# Altium schematic symbol library Oscillators - Crystals.SchLib: 746 symbols (part 4 of 5) (continued)
## CX3225GB16000P0HPQCC (continued)
CRYSTAL 16.0000MHZ 18PF SMD; Part Number: CX3225GB16000P0HPQCC; Manufacturer: Kyocera International Inc. Electronic Components; ESR (Equivalent Series Resistance): 80 Ohms; Frequency Stability: ±30ppm; Frequency Tolerance: ±20ppm; Operating Mode: Fundamental; ComponentLink1Description: Datasheet; ComponentLink1URL: //media.digikey.com/pdf/Data%20Sheets/AVX%20PDFs/CX3225GB_Series_Spec.pdf; ComponentLink2Description: DigiKey Link; ComponentLink2URL: http://digikey.com/product-detail/en/kyocera-international-inc-electronic-components/CX3225GB16000P0HPQCC/1253-1182-1-ND/4454030; Frequency: 16MHz; Height - Seated (Max): 0.035" (0.90mm); LastUpdated: 9/2/2020 1:21:57 AM; Lifecycle Status: Active; Load Capacitance: 18pF; Minimum Order: 1; Mounting Type: Surface Mount; Operating Temperature: -40°C ~ 85°C; Package / Case: 4-SMD, No Lead; Packaging: TapeAndReel; PartId: 490; Part Status: Active; Price: 0.35; Series: CX3225GB, Kyocera; Size / Dimension: 0.126" L x 0.098" W (3.20mm x 2.50mm); Supplier 1: DigiKey; Supplier Part Number 1: 1253-1182-1-ND; Type: MHz Crystal; Value: 16MHz
footprint KYOCERA CX3225GB
pins: 1, 3

## CX3225GB16384P0HPQCC
designator Y?, comment 16.384MHz
CRYSTAL 16.3840MHZ 18PF SMD; Part Number: CX3225GB16384P0HPQCC; Manufacturer: Kyocera International Inc. Electronic Components; ESR (Equivalent Series Resistance): 80 Ohms; Frequency Stability: ±30ppm; Frequency Tolerance: ±20ppm; Operating Mode: Fundamental; ComponentLink1Description: Datasheet; ComponentLink1URL: //media.digikey.com/pdf/Data%20Sheets/AVX%20PDFs/CX3225GB_Series_Spec.pdf; ComponentLink2Description: DigiKey Link; ComponentLink2URL: http://digikey.com/product-detail/en/kyocera-international-inc-electronic-components/CX3225GB16384P0HPQCC/1253-1183-1-ND/4454031; Frequency: 16.384MHz; Height - Seated (Max): 0.035" (0.90mm); LastUpdated: 9/2/2020 1:21:57 AM; Lifecycle Status: Active; Load Capacitance: 18pF; Minimum Order: 1; Mounting Type: Surface Mount; Operating Temperature: -40°C ~ 85°C; Package / Case: 4-SMD, No Lead; Packaging: TapeAndReel; PartId: 507; Part Status: Active; Price: 0.39; Series: CX3225GB, Kyocera; Size / Dimension: 0.126" L x 0.098" W (3.20mm x 2.50mm); Supplier 1: DigiKey; Supplier Part Number 1: 1253-1183-1-ND; Type: MHz Crystal; Value: 16.384MHz
footprint KYOCERA CX3225GB
pins: 1, 3

## CX3225GB18432D0HEQCC
designator Y?, comment 18.432MHz
CRYSTAL 18.4320MHZ 8PF SMD; Part Number: CX3225GB18432D0HEQCC; Manufacturer: Kyocera International Inc. Electronic Components; ESR (Equivalent Series Resistance): 80 Ohms; Frequency Stability: ±30ppm; Frequency Tolerance: ±20ppm; Operating Mode: Fundamental; ComponentLink1Description: Datasheet; ComponentLink1URL: //media.digikey.com/pdf/Data%20Sheets/AVX%20PDFs/CX3225GBxD0HEQ_Series_Spec.pdf; ComponentLink2Description: DigiKey Link; ComponentLink2URL: http://digikey.com/product-detail/en/kyocera-international-inc-electronic-components/CX3225GB18432D0HEQCC/1253-1184-1-ND/4453987; Frequency: 18.432MHz; Height - Seated (Max): 0.035" (0.90mm); LastUpdated: 9/2/2020 1:21:57 AM; Lifecycle Status: Active; Load Capacitance: 8pF; Minimum Order: 1; Mounting Type: Surface Mount; Operating Temperature: -10°C ~ 70°C; Package / Case: 4-SMD, No Lead; Packaging: TapeAndReel; PartId: 495; Part Status: Active; Price: 0.38; Series: CX3225GB, Kyocera; Size / Dimension: 0.126" L x 0.098" W (3.20mm x 2.50mm); Supplier 1: DigiKey; Supplier Part Number 1: 1253-1184-1-ND; Type: MHz Crystal; Value: 18.432MHz
footprint KYOCERA CX3225GB
pins: 1, 3

## CX3225GB19200P0HPQCC
designator Y?, comment 19.2MHz
CRYSTAL 19.2000MHZ 18PF SMD; Part Number: CX3225GB19200P0HPQCC; Manufacturer: Kyocera International Inc. Electronic Components; ESR (Equivalent Series Resistance): 80 Ohms; Frequency Stability: ±30ppm; Frequency Tolerance: ±20ppm; Operating Mode: Fundamental; ComponentLink1Description: Datasheet; ComponentLink1URL: //media.digikey.com/pdf/Data%20Sheets/AVX%20PDFs/CX3225GB_Series_Spec.pdf; ComponentLink2Description: DigiKey Link; ComponentLink2URL: http://digikey.com/product-detail/en/kyocera-international-inc-electronic-components/CX3225GB19200P0HPQCC/1253-1189-1-ND/4454033; Frequency: 19.2MHz; Height - Seated (Max): 0.035" (0.90mm); LastUpdated: 9/2/2020 1:21:57 AM; Lifecycle Status: Active; Load Capacitance: 18pF; Minimum Order: 1; Mounting Type: Surface Mount; Operating Temperature: -40°C ~ 85°C; Package / Case: 4-SMD, No Lead; Packaging: TapeAndReel; PartId: 506; Part Status: Active; Price: 0.39; Series: CX3225GB, Kyocera; Size / Dimension: 0.126" L x 0.098" W (3.20mm x 2.50mm); Supplier 1: DigiKey; Supplier Part Number 1: 1253-1189-1-ND; Type: MHz Crystal; Value: 19.2MHz
footprint KYOCERA CX3225GB
pins: 1, 3

## CX3225GB20000D0HPQCC
designator Y?, comment 20MHz
CRYSTAL 20.0000MHZ 8PF SMD; Part Number: CX3225GB20000D0HPQCC; Manufacturer: Kyocera International Inc. Electronic Components; ESR (Equivalent Series Resistance): 60 Ohms; Frequency Stability: ±30ppm; Frequency Tolerance: ±20ppm; Operating Mode: Fundamental; ComponentLink1Description: Datasheet; ComponentLink1URL: //media.digikey.com/pdf/Data%20Sheets/AVX%20PDFs/CX3225GBxD0HPQCC_Series_Spec.pdf; ComponentLink2Description: DigiKey Link; ComponentLink2URL: http://digikey.com/product-detail/en/kyocera-international-inc-electronic-components/CX3225GB20000D0HPQCC/1253-1191-1-ND/4454010; Frequency: 20MHz; Height - Seated (Max): 0.035" (0.90mm); LastUpdated: 9/2/2020 1:21:57 AM; Lifecycle Status: Active; Load Capacitance: 8pF; Minimum Order: 1; Mounting Type: Surface Mount; Operating Temperature: -40°C ~ 85°C; Package / Case: 4-SMD, No Lead; Packaging: TapeAndReel; PartId: 508; Part Status: Active; Price: 0.39; Series: CX3225GB, Kyocera; Size / Dimension: 0.126" L x 0.098" W (3.20mm x 2.50mm); Supplier 1: DigiKey; Supplier Part Number 1: 1253-1191-1-ND; Type: MHz Crystal; Value: 20MHz
footprint KYOCERA CX3225GB
pins: 1, 3

## CX3225GB22579P0HPQCC
designator Y?, comment 22.5792MHz
CRYSTAL 22.5792MHZ 18PF SMD; Part Number: CX3225GB22579P0HPQCC; Manufacturer: Kyocera International Inc. Electronic Components; ESR (Equivalent Series Resistance): 60 Ohms; Frequency Stability: ±30ppm; Frequency Tolerance: ±20ppm; Operating Mode: Fundamental; ComponentLink1Description: Datasheet; ComponentLink1URL: //media.digikey.com/pdf/Data%20Sheets/AVX%20PDFs/CX3225GB_Series_Spec.pdf; ComponentLink2Description: DigiKey Link; ComponentLink2URL: http://digikey.com/product-detail/en/kyocera-international-inc-electronic-components/CX3225GB22579P0HPQCC/1253-1195-1-ND/4454035; Frequency: 22.5792MHz; Height - Seated (Max): 0.035" (0.90mm); LastUpdated: 9/2/2020 1:21:57 AM; Lifecycle Status: Active; Load Capacitance: 18pF; Minimum Order: 1; Mounting Type: Surface Mount; Operating Temperature: -40°C ~ 85°C; Package / Case: 4-SMD, No Lead; Packaging: TapeAndReel; PartId: 497; Part Status: Active; Price: 0.39; Series: CX3225GB, Kyocera; Size / Dimension: 0.126" L x 0.098" W (3.20mm x 2.50mm); Supplier 1: DigiKey; Supplier Part Number 1: 1253-1195-1-ND; Type: MHz Crystal; Value: 22.5792MHz
footprint KYOCERA CX3225GB
pins: 1, 3

## CX3225GB24000D0HEQCC
designator Y?, comment 24MHz
CRYSTAL 24.0000MHZ 8PF SMD; Part Number: CX3225GB24000D0HEQCC; Manufacturer: Kyocera International Inc. Electronic Components; ESR (Equivalent Series Resistance): 60 Ohms; Frequency Stability: ±30ppm; Frequency Tolerance: ±20ppm; Operating Mode: Fundamental; ComponentLink1Description: Datasheet; ComponentLink1URL: //media.digikey.com/pdf/Data%20Sheets/AVX%20PDFs/CX3225GBxD0HEQ_Series_Spec.pdf; ComponentLink2Description: DigiKey Link; ComponentLink2URL: http://digikey.com/product-detail/en/kyocera-international-inc-electronic-components/CX3225GB24000D0HEQCC/1253-1196-1-ND/4453991; Frequency: 24MHz; Height - Seated (Max): 0.035" (0.90mm); LastUpdated: 9/2/2020 1:21:57 AM; Lifecycle Status: Active; Load Capacitance: 8pF; Minimum Order: 1; Mounting Type: Surface Mount; Operating Temperature: -10°C ~ 70°C; Package / Case: 4-SMD, No Lead; Packaging: TapeAndReel; PartId: 504; Part Status: Active; Price: 0.33; Series: CX3225GB, Kyocera; Size / Dimension: 0.126" L x 0.098" W (3.20mm x 2.50mm); Supplier 1: DigiKey; Supplier Part Number 1: 1253-1196-1-ND; Type: MHz Crystal; Value: 24MHz
footprint KYOCERA CX3225GB
pins: 1, 3

## CX3225GB24000P0HPQCC
designator Y?, comment 24MHz
CRYSTAL 24.0000MHZ 18PF SMD; Part Number: CX3225GB24000P0HPQCC; Manufacturer: Kyocera International Inc. Electronic Components; ESR (Equivalent Series Resistance): 60 Ohms; Frequency Stability: ±30ppm; Frequency Tolerance: ±20ppm; Operating Mode: Fundamental; ComponentLink1Description: Datasheet; ComponentLink1URL: //media.digikey.com/pdf/Data%20Sheets/AVX%20PDFs/CX3225GB_Series_Spec.pdf; ComponentLink2Description: DigiKey Link; ComponentLink2URL: http://digikey.com/product-detail/en/kyocera-international-inc-electronic-components/CX3225GB24000P0HPQCC/1253-1198-1-ND/4454036; Frequency: 24MHz; Height - Seated (Max): 0.035" (0.90mm); LastUpdated: 9/2/2020 1:21:57 AM; Lifecycle Status: Active; Load Capacitance: 18pF; Minimum Order: 1; Mounting Type: Surface Mount; Operating Temperature: -40°C ~ 85°C; Package / Case: 4-SMD, No Lead; Packaging: TapeAndReel; PartId: 491; Part Status: Active; Price: 0.35; Series: CX3225GB, Kyocera; Size / Dimension: 0.126" L x 0.098" W (3.20mm x 2.50mm); Supplier 1: DigiKey; Supplier Part Number 1: 1253-1198-1-ND; Type: MHz Crystal; Value: 24MHz
footprint KYOCERA CX3225GB
pins: 1, 3

## CX3225GB24576D0HPQCC
designator Y?, comment 24.576MHz
CRYSTAL 24.5760MHZ 8PF SMD; Part Number: CX3225GB24576D0HPQCC; Manufacturer: Kyocera International Inc. Electronic Components; ESR (Equivalent Series Resistance): 60 Ohms; Frequency Stability: ±30ppm; Frequency Tolerance: ±20ppm; Operating Mode: Fundamental; ComponentLink1Description: Datasheet; ComponentLink1URL: //media.digikey.com/pdf/Data%20Sheets/AVX%20PDFs/CX3225GBxD0HPQCC_Series_Spec.pdf; ComponentLink2Description: DigiKey Link; ComponentLink2URL: http://digikey.com/product-detail/en/kyocera-international-inc-electronic-components/CX3225GB24576D0HPQCC/1253-1200-1-ND/4454013; Frequency: 24.576MHz; Height - Seated (Max): 0.035" (0.90mm); LastUpdated: 9/2/2020 1:21:57 AM; Lifecycle Status: Active; Load Capacitance: 8pF; Minimum Order: 1; Mounting Type: Surface Mount; Operating Temperature: -40°C ~ 85°C; Package / Case: 4-SMD, No Lead; Packaging: TapeAndReel; PartId: 486; Part Status: Active; Price: 0.39; Series: CX3225GB, Kyocera; Size / Dimension: 0.126" L x 0.098" W (3.20mm x 2.50mm); Supplier 1: DigiKey; Supplier Part Number 1: 1253-1200-1-ND; Type: MHz Crystal; Value: 24.576MHz
footprint KYOCERA CX3225GB
pins: 1, 3

## CX3225GB25000D0HEQCC
designator Y?, comment 25MHz
CRYSTAL 25.0000MHZ 8PF SMD; Part Number: CX3225GB25000D0HEQCC; Manufacturer: Kyocera International Inc. Electronic Components; ESR (Equivalent Series Resistance): 60 Ohms; Frequency Stability: ±30ppm; Frequency Tolerance: ±20ppm; Operating Mode: Fundamental; ComponentLink1Description: Datasheet; ComponentLink1URL: //media.digikey.com/pdf/Data%20Sheets/AVX%20PDFs/CX3225GBxD0HEQ_Series_Spec.pdf; ComponentLink2Description: DigiKey Link; ComponentLink2URL: http://digikey.com/product-detail/en/kyocera-international-inc-electronic-components/CX3225GB25000D0HEQCC/1253-1202-1-ND/4453993; Frequency: 25MHz; Height - Seated (Max): 0.035" (0.90mm); LastUpdated: 9/2/2020 1:21:57 AM; Lifecycle Status: Active; Load Capacitance: 8pF; Minimum Order: 1; Mounting Type: Surface Mount; Operating Temperature: -10°C ~ 70°C; Package / Case: 4-SMD, No Lead; Packaging: TapeAndReel; PartId: 494; Part Status: Active; Price: 0.38; Series: CX3225GB, Kyocera; Size / Dimension: 0.126" L x 0.098" W (3.20mm x 2.50mm); Supplier 1: DigiKey; Supplier Part Number 1: 1253-1202-1-ND; Type: MHz Crystal; Value: 25MHz
footprint KYOCERA CX3225GB
pins: 1, 3

## CX3225GB25000D0HPQCC
designator Y?, comment 25MHz
CRYSTAL 25.0000MHZ 8PF SMD; Part Number: CX3225GB25000D0HPQCC; Manufacturer: Kyocera International Inc. Electronic Components; ESR (Equivalent Series Resistance): 60 Ohms; Frequency Stability: ±30ppm; Frequency Tolerance: ±20ppm; Operating Mode: Fundamental; ComponentLink1Description: Datasheet; ComponentLink1URL: //media.digikey.com/pdf/Data%20Sheets/AVX%20PDFs/CX3225GBxD0HPQCC_Series_Spec.pdf; ComponentLink2Description: DigiKey Link; ComponentLink2URL: http://digikey.com/product-detail/en/kyocera-international-inc-electronic-components/CX3225GB25000D0HPQCC/1253-1203-1-ND/4454014; Frequency: 25MHz; Height - Seated (Max): 0.035" (0.90mm); LastUpdated: 9/2/2020 1:21:57 AM; Lifecycle Status: Active; Load Capacitance: 8pF; Minimum Order: 1; Mounting Type: Surface Mount; Operating Temperature: -40°C ~ 85°C; Package / Case: 4-SMD, No Lead; Packaging: TapeAndReel; PartId: 505; Part Status: Active; Price: 0.39; Series: CX3225GB, Kyocera; Size / Dimension: 0.126" L x 0.098" W (3.20mm x 2.50mm); Supplier 1: DigiKey; Supplier Part Number 1: 1253-1203-1-ND; Type: MHz Crystal; Value: 25MHz
footprint KYOCERA CX3225GB
pins: 1, 3

## CX3225GB25000P0HPQCC
designator Y?, comment 25MHz
CRYSTAL 25.0000MHZ 18PF SMD; Part Number: CX3225GB25000P0HPQCC; Manufacturer: Kyocera International Inc. Electronic Components; ESR (Equivalent Series Resistance): 60 Ohms; Frequency Stability: ±30ppm; Frequency Tolerance: ±20ppm; Operating Mode: Fundamental; ComponentLink1Description: Datasheet; ComponentLink1URL: //media.digikey.com/pdf/Data%20Sheets/AVX%20PDFs/CX3225GB_Series_Spec.pdf; ComponentLink2Description: DigiKey Link; ComponentLink2URL: http://digikey.com/product-detail/en/kyocera-international-inc-electronic-components/CX3225GB25000P0HPQCC/1253-1204-1-ND/4454038; Frequency: 25MHz; Height - Seated (Max): 0.035" (0.90mm); LastUpdated: 9/2/2020 1:21:57 AM; Lifecycle Status: Active; Load Capacitance: 18pF; Minimum Order: 1; Mounting Type: Surface Mount; Operating Temperature: -40°C ~ 85°C; Package / Case: 4-SMD, No Lead; Packaging: TapeAndReel; PartId: 500; Part Status: Active; Price: 0.41; Series: CX3225GB, Kyocera; Size / Dimension: 0.126" L x 0.098" W (3.20mm x 2.50mm); Supplier 1: DigiKey; Supplier Part Number 1: 1253-1204-1-ND; Type: MHz Crystal; Value: 25MHz
footprint KYOCERA CX3225GB
pins: 1, 3

## CX3225GB27000D0HEQCC
designator Y?, comment 27MHz
CRYSTAL 27.0000MHZ 8PF SMD; Part Number: CX3225GB27000D0HEQCC; Manufacturer: Kyocera International Inc. Electronic Components; ESR (Equivalent Series Resistance): 50 Ohms; Frequency Stability: ±30ppm; Frequency Tolerance: ±20ppm; Operating Mode: Fundamental; ComponentLink1Description: Datasheet; ComponentLink1URL: //media.digikey.com/pdf/Data%20Sheets/AVX%20PDFs/CX3225GBxD0HEQ_Series_Spec.pdf; ComponentLink2Description: DigiKey Link; ComponentLink2URL: http://digikey.com/product-detail/en/kyocera-international-inc-electronic-components/CX3225GB27000D0HEQCC/1253-1205-1-ND/4453994; Frequency: 27MHz; Height - Seated (Max): 0.035" (0.90mm); LastUpdated: 9/2/2020 1:21:56 AM; Lifecycle Status: Active; Load Capacitance: 8pF; Minimum Order: 1; Mounting Type: Surface Mount; Operating Temperature: -10°C ~ 70°C; Package / Case: 4-SMD, No Lead; Packaging: TapeAndReel; PartId: 511; Part Status: Active; Price: 0.38; Series: CX3225GB, Kyocera; Size / Dimension: 0.126" L x 0.098" W (3.20mm x 2.50mm); Supplier 1: DigiKey; Supplier Part Number 1: 1253-1205-1-ND; Type: MHz Crystal; Value: 27MHz
footprint KYOCERA CX3225GB
pins: 1, 3

## CX3225GB27000P0HPQCC
designator Y?, comment 27MHz
CRYSTAL 27.0000MHZ 18PF SMD; Part Number: CX3225GB27000P0HPQCC; Manufacturer: Kyocera International Inc. Electronic Components; ESR (Equivalent Series Resistance): 50 Ohms; Frequency Stability: ±30ppm; Frequency Tolerance: ±20ppm; Operating Mode: Fundamental; ComponentLink1Description: Datasheet; ComponentLink1URL: //media.digikey.com/pdf/Data%20Sheets/AVX%20PDFs/CX3225GB_Series_Spec.pdf; ComponentLink2Description: DigiKey Link; ComponentLink2URL: http://digikey.com/product-detail/en/kyocera-international-inc-electronic-components/CX3225GB27000P0HPQCC/1253-1207-1-ND/4454039; Frequency: 27MHz; Height - Seated (Max): 0.035" (0.90mm); LastUpdated: 9/2/2020 1:21:57 AM; Lifecycle Status: Active; Load Capacitance: 18pF; Minimum Order: 1; Mounting Type: Surface Mount; Operating Temperature: -40°C ~ 85°C; Package / Case: 4-SMD, No Lead; Packaging: TapeAndReel; PartId: 498; Part Status: Active; Price: 0.39; Series: CX3225GB, Kyocera; Size / Dimension: 0.126" L x 0.098" W (3.20mm x 2.50mm); Supplier 1: DigiKey; Supplier Part Number 1: 1253-1207-1-ND; Type: MHz Crystal; Value: 27MHz
footprint KYOCERA CX3225GB
pins: 1, 3

## CX3225GB27120P0HPQCC
designator Y?, comment 27.12MHz
CRYSTAL 27.1200MHZ 18PF SMD; Part Number: CX3225GB27120P0HPQCC; Manufacturer: Kyocera International Inc. Electronic Components; ESR (Equivalent Series Resistance): 50 Ohms; Frequency Stability: ±30ppm; Frequency Tolerance: ±20ppm; Operating Mode: Fundamental; ComponentLink1Description: Datasheet; ComponentLink1URL: //media.digikey.com/pdf/Data%20Sheets/AVX%20PDFs/CX3225GB_Series_Spec.pdf; ComponentLink2Description: DigiKey Link; ComponentLink2URL: http://digikey.com/product-detail/en/kyocera-international-inc-electronic-components/CX3225GB27120P0HPQCC/1253-1208-1-ND/4454040; Frequency: 27.12MHz; Height - Seated (Max): 0.035" (0.90mm); LastUpdated: 9/2/2020 1:21:57 AM; Lifecycle Status: Active; Load Capacitance: 18pF; Minimum Order: 1; Mounting Type: Surface Mount; Operating Temperature: -40°C ~ 85°C; Package / Case: 4-SMD, No Lead; Packaging: TapeAndReel; PartId: 501; Part Status: Active; Price: 0.41; Series: CX3225GB, Kyocera; Size / Dimension: 0.126" L x 0.098" W (3.20mm x 2.50mm); Supplier 1: DigiKey; Supplier Part Number 1: 1253-1208-1-ND; Type: MHz Crystal; Value: 27.12MHz
footprint KYOCERA CX3225GB
pins: 1, 3

## CX3225GB32000D0HEQCC
designator Y?, comment 32MHz
CRYSTAL 32.0000MHZ 8PF SMD; Part Number: CX3225GB32000D0HEQCC; Manufacturer: Kyocera International Inc. Electronic Components; ESR (Equivalent Series Resistance): 50 Ohms; Frequency Stability: ±30ppm; Frequency Tolerance: ±20ppm; Operating Mode: Fundamental; ComponentLink1Description: Datasheet; ComponentLink1URL: //media.digikey.com/pdf/Data%20Sheets/AVX%20PDFs/CX3225GBxD0HEQ_Series_Spec.pdf; ComponentLink2Description: DigiKey Link; ComponentLink2URL: http://digikey.com/product-detail/en/kyocera-international-inc-electronic-components/CX3225GB32000D0HEQCC/1253-1212-1-ND/4453996; Frequency: 32MHz; Height - Seated (Max): 0.035" (0.90mm); LastUpdated: 9/2/2020 1:21:57 AM; Lifecycle Status: Active; Load Capacitance: 8pF; Minimum Order: 1; Mounting Type: Surface Mount; Operating Temperature: -10°C ~ 70°C; Package / Case: 4-SMD, No Lead; Packaging: TapeAndReel; PartId: 493; Part Status: Active; Price: 0.38; Series: CX3225GB, Kyocera; Size / Dimension: 0.126" L x 0.098" W (3.20mm x 2.50mm); Supplier 1: DigiKey; Supplier Part Number 1: 1253-1212-1-ND; Type: MHz Crystal; Value: 32MHz
footprint KYOCERA CX3225GB
pins: 1, 3

## CX3225GB33333P0HPQCC
designator Y?, comment 33.333MHz
CRYSTAL 33.3330MHZ 18PF SMD; Part Number: CX3225GB33333P0HPQCC; Manufacturer: Kyocera International Inc. Electronic Components; ESR (Equivalent Series Resistance): 50 Ohms; Frequency Stability: ±30ppm; Frequency Tolerance: ±20ppm; Operating Mode: Fundamental; ComponentLink1Description: Datasheet; ComponentLink1URL: //media.digikey.com/pdf/Data%20Sheets/AVX%20PDFs/CX3225GB_Series_Spec.pdf; ComponentLink2Description: DigiKey Link; ComponentLink2URL: http://digikey.com/product-detail/en/kyocera-international-inc-electronic-components/CX3225GB33333P0HPQCC/1253-1217-1-ND/4454043; Frequency: 33.333MHz; Height - Seated (Max): 0.035" (0.90mm); LastUpdated: 9/2/2020 1:21:57 AM; Lifecycle Status: Active; Load Capacitance: 18pF; Minimum Order: 1; Mounting Type: Surface Mount; Operating Temperature: -40°C ~ 85°C; Package / Case: 4-SMD, No Lead; Packaging: TapeAndReel; PartId: 499; Part Status: Active; Price: 0.39; Series: CX3225GB, Kyocera; Size / Dimension: 0.126" L x 0.098" W (3.20mm x 2.50mm); Supplier 1: DigiKey; Supplier Part Number 1: 1253-1217-1-ND; Type: MHz Crystal; Value: 33.333MHz
footprint KYOCERA CX3225GB
pins: 1, 3

## CX3225GB36000P0HPQCC
designator Y?, comment 36MHz
CRYSTAL 36.0000MHZ 18PF SMD; Part Number: CX3225GB36000P0HPQCC; Manufacturer: Kyocera International Inc. Electronic Components; ESR (Equivalent Series Resistance): 50 Ohms; Frequency Stability: ±30ppm; Frequency Tolerance: ±20ppm; Operating Mode: Fundamental; ComponentLink1Description: Datasheet; ComponentLink1URL: //media.digikey.com/pdf/Data%20Sheets/AVX%20PDFs/CX3225GB_Series_Spec.pdf; ComponentLink2Description: DigiKey Link; ComponentLink2URL: http://digikey.com/product-detail/en/kyocera-international-inc-electronic-components/CX3225GB36000P0HPQCC/1253-1218-1-ND/4454044; Frequency: 36MHz; Height - Seated (Max): 0.035" (0.90mm); LastUpdated: 9/2/2020 1:21:56 AM; Lifecycle Status: Active; Load Capacitance: 18pF; Minimum Order: 1; Mounting Type: Surface Mount; Operating Temperature: -40°C ~ 85°C; Package / Case: 4-SMD, No Lead; Packaging: TapeAndReel; PartId: 514; Part Status: Active; Price: 0.39; Series: CX3225GB, Kyocera; Size / Dimension: 0.126" L x 0.098" W (3.20mm x 2.50mm); Supplier 1: DigiKey; Supplier Part Number 1: 1253-1218-1-ND; Type: MHz Crystal; Value: 36MHz
footprint KYOCERA CX3225GB
pins: 1, 3

## CX3225GB49152P0HPQCC
designator Y?, comment 49.152MHz
CRYSTAL 49.1520MHZ 18PF SMD; Part Number: CX3225GB49152P0HPQCC; Manufacturer: Kyocera International Inc. Electronic Components; ESR (Equivalent Series Resistance): 50 Ohms; Frequency Stability: ±30ppm; Frequency Tolerance: ±20ppm; Operating Mode: Fundamental; ComponentLink1Description: Datasheet; ComponentLink1URL: //media.digikey.com/pdf/Data%20Sheets/AVX%20PDFs/CX3225GB_Series_Spec.pdf; ComponentLink2Description: DigiKey Link; ComponentLink2URL: http://digikey.com/product-detail/en/kyocera-international-inc-electronic-components/CX3225GB49152P0HPQCC/1253-1346-1-ND/4896436; Frequency: 49.152MHz; Height - Seated (Max): 0.035" (0.90mm); LastUpdated: 9/2/2020 1:21:57 AM; Lifecycle Status: Active; Load Capacitance: 18pF; Minimum Order: 1; Mounting Type: Surface Mount; Operating Temperature: -40°C ~ 85°C; Package / Case: 4-SMD, No Lead; Packaging: TapeAndReel; PartId: 502; Part Status: Active; Price: 0.36; Series: CX3225GB, Kyocera; Size / Dimension: 0.126" L x 0.098" W (3.20mm x 2.50mm); Supplier 1: DigiKey; Supplier Part Number 1: 1253-1346-1-ND; Type: MHz Crystal; Value: 49.152MHz
footprint KYOCERA CX3225GB
pins: 1, 3

## ECS-120-20-3X-EN-TR
designator Y?, comment 12MHz
CRYSTAL 12.0000MHZ 20PF SMD; Part Number: ECS-120-20-3X-EN-TR; Manufacturer: ECS Inc.; ESR (Equivalent Series Resistance): 60 Ohms; Frequency Stability: ±50ppm; Frequency Tolerance: ±30ppm; Operating Mode: Fundamental; ComponentLink1Description: Datasheet; ComponentLink1URL: http://www.ecsxtal.com/store/pdf/CSM-3X.pdf; ComponentLink2Description: DigiKey Link; ComponentLink2URL: http://digikey.com/product-detail/en/ecs-inc/ECS-120-20-3X-EN-TR/XC1787CT-ND/2676651; Frequency: 12MHz; Height - Seated (Max): 0.091" (2.30mm); LastUpdated: 9/2/2020 1:21:54 AM; Lifecycle Status: Active; Load Capacitance: 20pF; Minimum Order: 1; Mounting Type: Surface Mount; Operating Temperature: -40°C ~ 85°C; Package / Case: HC-49/US; Packaging: TapeAndReel; PartId: 407; Part Status: Active; Price: 0.24; Series: CSM-3X; Size / Dimension: 0.276" L x 0.161" W (7.00mm x 4.10mm); Supplier 1: DigiKey; Supplier Part Number 1: XC1787CT-ND; Type: MHz Crystal; Value: 12MHz
footprint ECS CSM-3X
pins: 1, 2

## ECS-120-20-3X-TR
designator Y?, comment 12MHz
CRYSTAL 12.0000MHZ 20PF SMD; Part Number: ECS-120-20-3X-TR; Manufacturer: ECS Inc.; ESR (Equivalent Series Resistance): 60 Ohms; Frequency Stability: ±50ppm; Frequency Tolerance: ±30ppm; Operating Mode: Fundamental; ComponentLink1Description: Datasheet; ComponentLink1URL: http://www.ecsxtal.com/store/pdf/CSM-3X.pdf; ComponentLink2Description: DigiKey Link; ComponentLink2URL: http://digikey.com/product-detail/en/ecs-inc/ECS-120-20-3X-TR/XC1770CT-ND/2676634; Frequency: 12MHz; Height - Seated (Max): 0.091" (2.30mm); LastUpdated: 9/2/2020 1:21:54 AM; Lifecycle Status: Active; Load Capacitance: 20pF; Minimum Order: 1; Mounting Type: Surface Mount; Operating Temperature: -10°C ~ 70°C; Package / Case: HC-49/US; Packaging: TapeAndReel; PartId: 401; Part Status: Active; Price: 0.17; Series: CSM-3X; Size / Dimension: 0.276" L x 0.161" W (7.00mm x 4.10mm); Supplier 1: DigiKey; Supplier Part Number 1: XC1770CT-ND; Type: MHz Crystal; Value: 12MHz
footprint ECS CSM-3X
pins: 1, 2

## ECS-122.8-20-3X-EN-TR
designator Y?, comment 12.288MHz
CRYSTAL 12.2880MHZ 20PF SMD; Part Number: ECS-122.8-20-3X-EN-TR; Manufacturer: ECS Inc.; ESR (Equivalent Series Resistance): 60 Ohms; Frequency Stability: ±50ppm; Frequency Tolerance: ±30ppm; Operating Mode: Fundamental; ComponentLink1Description: Datasheet; ComponentLink1URL: http://www.ecsxtal.com/store/pdf/CSM-3X.pdf; ComponentLink2Description: DigiKey Link; ComponentLink2URL: http://digikey.com/product-detail/en/ecs-inc/ECS-122.8-20-3X-EN-TR/XC1788CT-ND/2676652; Frequency: 12.288MHz; Height - Seated (Max): 0.091" (2.30mm); LastUpdated: 9/2/2020 1:21:54 AM; Lifecycle Status: Active; Load Capacitance: 20pF; Minimum Order: 1; Mounting Type: Surface Mount; Operating Temperature: -40°C ~ 85°C; Package / Case: HC-49/US; Packaging: TapeAndReel; PartId: 405; Part Status: Active; Price: 0.21; Series: CSM-3X; Size / Dimension: 0.276" L x 0.161" W (7.00mm x 4.10mm); Supplier 1: DigiKey; Supplier Part Number 1: XC1788CT-ND; Type: MHz Crystal; Value: 12.288MHz
footprint ECS CSM-3X
pins: 1, 2

## ECS-122.8-20-3X-TR
designator Y?, comment 12.288MHz
CRYSTAL 12.2880MHZ 20PF SMD; Part Number: ECS-122.8-20-3X-TR; Manufacturer: ECS Inc.; ESR (Equivalent Series Resistance): 60 Ohms; Frequency Stability: ±50ppm; Frequency Tolerance: ±30ppm; Operating Mode: Fundamental; ComponentLink1Description: Datasheet; ComponentLink1URL: http://www.ecsxtal.com/store/pdf/CSM-3X.pdf; ComponentLink2Description: DigiKey Link; ComponentLink2URL: http://digikey.com/product-detail/en/ecs-inc/ECS-122.8-20-3X-TR/XC1771CT-ND/2676635; Frequency: 12.288MHz; Height - Seated (Max): 0.091" (2.30mm); LastUpdated: 9/2/2020 1:21:54 AM; Lifecycle Status: Active; Load Capacitance: 20pF; Minimum Order: 1; Mounting Type: Surface Mount; Operating Temperature: -10°C ~ 70°C; Package / Case: HC-49/US; Packaging: CutTape; PartId: 415; Part Status: Active; Price: 0.38; Series: CSM-3X; Size / Dimension: 0.276" L x 0.161" W (7.00mm x 4.10mm); Supplier 1: DigiKey; Supplier Part Number 1: XC1771CT-ND; Type: MHz Crystal; Value: 12.288MHz
footprint ECS CSM-3X
pins: 1, 2

## ECS-130-20-3X-TR
designator Y?, comment 13MHz
CRYSTAL 13.0000MHZ 20PF SMD; Part Number: ECS-130-20-3X-TR; Manufacturer: ECS Inc.; ESR (Equivalent Series Resistance): 60 Ohms; Frequency Stability: ±50ppm; Frequency Tolerance: ±30ppm; Operating Mode: Fundamental; ComponentLink1Description: Datasheet; ComponentLink1URL: http://www.ecsxtal.com/store/pdf/CSM-3X.pdf; ComponentLink2Description: DigiKey Link; ComponentLink2URL: http://digikey.com/product-detail/en/ecs-inc/ECS-130-20-3X-TR/XC1772CT-ND/2676636; Frequency: 13MHz; Height - Seated (Max): 0.091" (2.30mm); LastUpdated: 9/2/2020 1:21:54 AM; Lifecycle Status: Active; Load Capacitance: 20pF; Minimum Order: 1; Mounting Type: Surface Mount; Operating Temperature: -10°C ~ 70°C; Package / Case: HC-49/US; Packaging: TapeAndReel; PartId: 422; Part Status: Active; Price: 0.17; Series: CSM-3X; Size / Dimension: 0.276" L x 0.161" W (7.00mm x 4.10mm); Supplier 1: DigiKey; Supplier Part Number 1: XC1772CT-ND; Type: MHz Crystal; Value: 13MHz
footprint ECS CSM-3X
pins: 1, 2

## ECS-135.6-20-3X-EN-TR
designator Y?, comment 13.56MHz
CRYSTAL 13.5600MHZ 20PF SMD; Part Number: ECS-135.6-20-3X-EN-TR; Manufacturer: ECS Inc.; ESR (Equivalent Series Resistance): 60 Ohms; Frequency Stability: ±50ppm; Frequency Tolerance: ±30ppm; Operating Mode: Fundamental; ComponentLink1Description: Datasheet; ComponentLink1URL: http://www.ecsxtal.com/store/pdf/CSM-3X.pdf; ComponentLink2Description: DigiKey Link; ComponentLink2URL: http://digikey.com/product-detail/en/ecs-inc/ECS-135.6-20-3X-EN-TR/XC1790CT-ND/2676654; Frequency: 13.56MHz; Height - Seated (Max): 0.091" (2.30mm); LastUpdated: 9/2/2020 1:21:54 AM; Lifecycle Status: Active; Load Capacitance: 20pF; Minimum Order: 1; Mounting Type: Surface Mount; Operating Temperature: -40°C ~ 85°C; Package / Case: HC-49/US; Packaging: TapeAndReel; PartId: 425; Part Status: Active; Price: 0.21; Series: CSM-3X; Size / Dimension: 0.276" L x 0.161" W (7.00mm x 4.10mm); Supplier 1: DigiKey; Supplier Part Number 1: XC1790CT-ND; Type: MHz Crystal; Value: 13.56MHz
footprint ECS CSM-3X
pins: 1, 2

## ECS-135.6-20-3X-TR
designator Y?, comment 13.56MHz
CRYSTAL 13.5600MHZ 20PF SMD; Part Number: ECS-135.6-20-3X-TR; Manufacturer: ECS Inc.; ESR (Equivalent Series Resistance): 60 Ohms; Frequency Stability: ±50ppm; Frequency Tolerance: ±30ppm; Operating Mode: Fundamental; ComponentLink1Description: Datasheet; ComponentLink1URL: http://www.ecsxtal.com/store/pdf/CSM-3X.pdf; ComponentLink2Description: DigiKey Link; ComponentLink2URL: http://digikey.com/product-detail/en/ecs-inc/ECS-135.6-20-3X-TR/XC1773CT-ND/2676637; Frequency: 13.56MHz; Height - Seated (Max): 0.091" (2.30mm); LastUpdated: 9/2/2020 1:21:54 AM; Lifecycle Status: Active; Load Capacitance: 20pF; Minimum Order: 1; Mounting Type: Surface Mount; Operating Temperature: -10°C ~ 70°C; Package / Case: HC-49/US; Packaging: CutTape; PartId: 413; Part Status: Active; Price: 0.38; Series: CSM-3X; Size / Dimension: 0.276" L x 0.161" W (7.00mm x 4.10mm); Supplier 1: DigiKey; Supplier Part Number 1: XC1773CT-ND; Type: MHz Crystal; Value: 13.56MHz
footprint ECS CSM-3X
pins: 1, 2

## ECS-143-20-3X-EN-TR
designator Y?, comment 14.31818MHz
CRYSTAL 14.31818MHZ 20PF SMD; Part Number: ECS-143-20-3X-EN-TR; Manufacturer: ECS Inc.; ESR (Equivalent Series Resistance): 60 Ohms; Frequency Stability: ±50ppm; Frequency Tolerance: ±30ppm; Operating Mode: Fundamental; ComponentLink1Description: Datasheet; ComponentLink1URL: http://www.ecsxtal.com/store/pdf/CSM-3X.pdf; ComponentLink2Description: DigiKey Link; ComponentLink2URL: http://digikey.com/product-detail/en/ecs-inc/ECS-143-20-3X-EN-TR/XC1791CT-ND/2676655; Frequency: 14.31818MHz; Height - Seated (Max): 0.091" (2.30mm); LastUpdated: 9/2/2020 1:21:54 AM; Lifecycle Status: Active; Load Capacitance: 20pF; Minimum Order: 1; Mounting Type: Surface Mount; Operating Temperature: -40°C ~ 85°C; Package / Case: HC-49/US; Packaging: TapeAndReel; PartId: 420; Part Status: Active; Price: 0.17; Series: CSM-3X; Size / Dimension: 0.276" L x 0.161" W (7.00mm x 4.10mm); Supplier 1: DigiKey; Supplier Part Number 1: XC1791CT-ND; Type: MHz Crystal; Value: 14.31818MHz
footprint ECS CSM-3X
pins: 1, 2

## ECS-147.4-20-3X-EN-TR
designator Y?, comment 14.7456MHz
CRYSTAL 14.7456MHZ 20PF SMD; Part Number: ECS-147.4-20-3X-EN-TR; Manufacturer: ECS Inc.; ESR (Equivalent Series Resistance): 60 Ohms; Frequency Stability: ±50ppm; Frequency Tolerance: ±30ppm; Operating Mode: Fundamental; ComponentLink1Description: Datasheet; ComponentLink1URL: http://www.ecsxtal.com/store/pdf/CSM-3X.pdf; ComponentLink2Description: DigiKey Link; ComponentLink2URL: http://digikey.com/product-detail/en/ecs-inc/ECS-147.4-20-3X-EN-TR/XC1792CT-ND/2676656; Frequency: 14.7456MHz; Height - Seated (Max): 0.091" (2.30mm); LastUpdated: 9/2/2020 1:21:54 AM; Lifecycle Status: Active; Load Capacitance: 20pF; Minimum Order: 1; Mounting Type: Surface Mount; Operating Temperature: -40°C ~ 85°C; Package / Case: HC-49/US; Packaging: CutTape; PartId: 423; Part Status: Active; Price: 0.46; Series: CSM-3X; Size / Dimension: 0.276" L x 0.161" W (7.00mm x 4.10mm); Supplier 1: DigiKey; Supplier Part Number 1: XC1792CT-ND; Type: MHz Crystal; Value: 14.7456MHz
footprint ECS CSM-3X
pins: 1, 2

## ECS-147.4-20-3X-TR
designator Y?, comment 14.7456MHz
CRYSTAL 14.7456MHZ 20PF SMD; Part Number: ECS-147.4-20-3X-TR; Manufacturer: ECS Inc.; ESR (Equivalent Series Resistance): 60 Ohms; Frequency Stability: ±50ppm; Frequency Tolerance: ±30ppm; Operating Mode: Fundamental; ComponentLink1Description: Datasheet; ComponentLink1URL: http://www.ecsxtal.com/store/pdf/CSM-3X.pdf; ComponentLink2Description: DigiKey Link; ComponentLink2URL: http://digikey.com/product-detail/en/ecs-inc/ECS-147.4-20-3X-TR/XC1775CT-ND/2676639; Frequency: 14.7456MHz; Height - Seated (Max): 0.091" (2.30mm); LastUpdated: 9/2/2020 1:21:54 AM; Lifecycle Status: Active; Load Capacitance: 20pF; Minimum Order: 1; Mounting Type: Surface Mount; Operating Temperature: -10°C ~ 70°C; Package / Case: HC-49/US; Packaging: TapeAndReel; PartId: 414; Part Status: Active; Price: 0.17; Series: CSM-3X; Size / Dimension: 0.276" L x 0.161" W (7.00mm x 4.10mm); Supplier 1: DigiKey; Supplier Part Number 1: XC1775CT-ND; Type: MHz Crystal; Value: 14.7456MHz
footprint ECS CSM-3X
pins: 1, 2

## ECS-160-20-3X-EN-TR
designator Y?, comment 16MHz
CRYSTAL 16.0000MHZ 20PF SMD; Part Number: ECS-160-20-3X-EN-TR; Manufacturer: ECS Inc.; ESR (Equivalent Series Resistance): 50 Ohms; Frequency Stability: ±50ppm; Frequency Tolerance: ±30ppm; Operating Mode: Fundamental; ComponentLink1Description: Datasheet; ComponentLink1URL: http://www.ecsxtal.com/store/pdf/CSM-3X.pdf; ComponentLink2Description: DigiKey Link; ComponentLink2URL: http://digikey.com/product-detail/en/ecs-inc/ECS-160-20-3X-EN-TR/XC1793CT-ND/2676657; Frequency: 16MHz; Height - Seated (Max): 0.091" (2.30mm); LastUpdated: 9/2/2020 1:21:54 AM; Lifecycle Status: Active; Load Capacitance: 20pF; Minimum Order: 1; Mounting Type: Surface Mount; Operating Temperature: -40°C ~ 85°C; Package / Case: HC-49/US; Packaging: TapeAndReel; PartId: 406; Part Status: Active; Price: 0.21; Series: CSM-3X; Size / Dimension: 0.276" L x 0.161" W (7.00mm x 4.10mm); Supplier 1: DigiKey; Supplier Part Number 1: XC1793CT-ND; Type: MHz Crystal; Value: 16MHz
footprint ECS CSM-3X
pins: 1, 2

## ECS-160-20-3X-TR
designator Y?, comment 16MHz
CRYSTAL 16.0000MHZ 20PF SMD; Part Number: ECS-160-20-3X-TR; Manufacturer: ECS Inc.; ESR (Equivalent Series Resistance): 50 Ohms; Frequency Stability: ±50ppm; Frequency Tolerance: ±30ppm; Operating Mode: Fundamental; ComponentLink1Description: Datasheet; ComponentLink1URL: http://www.ecsxtal.com/store/pdf/CSM-3X.pdf; ComponentLink2Description: DigiKey Link; ComponentLink2URL: http://digikey.com/product-detail/en/ecs-inc/ECS-160-20-3X-TR/XC1776CT-ND/2676640; Frequency: 16MHz; Height - Seated (Max): 0.091" (2.30mm); LastUpdated: 9/2/2020 1:21:54 AM; Lifecycle Status: Active; Load Capacitance: 20pF; Minimum Order: 1; Mounting Type: Surface Mount; Operating Temperature: -10°C ~ 70°C; Package / Case: HC-49/US; Packaging: TapeAndReel; PartId: 400; Part Status: Active; Price: 0.17; Series: CSM-3X; Size / Dimension: 0.276" L x 0.161" W (7.00mm x 4.10mm); Supplier 1: DigiKey; Supplier Part Number 1: XC1776CT-ND; Type: MHz Crystal; Value: 16MHz
footprint ECS CSM-3X
pins: 1, 2

## ECS-184-20-3X-EN-TR
designator Y?, comment 18.432MHz
CRYSTAL 18.4320MHZ 20PF SMD; Part Number: ECS-184-20-3X-EN-TR; Manufacturer: ECS Inc.; ESR (Equivalent Series Resistance): 50 Ohms; Frequency Stability: ±50ppm; Frequency Tolerance: ±30ppm; Operating Mode: Fundamental; ComponentLink1Description: Datasheet; ComponentLink1URL: http://www.ecsxtal.com/store/pdf/CSM-3X.pdf; ComponentLink2Description: DigiKey Link; ComponentLink2URL: http://digikey.com/product-detail/en/ecs-inc/ECS-184-20-3X-EN-TR/XC1794CT-ND/2676658; Frequency: 18.432MHz; Height - Seated (Max): 0.091" (2.30mm); LastUpdated: 9/2/2020 1:21:54 AM; Lifecycle Status: Active; Load Capacitance: 20pF; Minimum Order: 1; Mounting Type: Surface Mount; Operating Temperature: -40°C ~ 85°C; Package / Case: HC-49/US; Packaging: TapeAndReel; PartId: 410; Part Status: Active; Price: 0.17; Series: CSM-3X; Size / Dimension: 0.276" L x 0.161" W (7.00mm x 4.10mm); Supplier 1: DigiKey; Supplier Part Number 1: XC1794CT-ND; Type: MHz Crystal; Value: 18.432MHz
footprint ECS CSM-3X
pins: 1, 2

## ECS-184-20-3X-TR
designator Y?, comment 18.432MHz
CRYSTAL 18.4320MHZ 20PF SMD; Part Number: ECS-184-20-3X-TR; Manufacturer: ECS Inc.; ESR (Equivalent Series Resistance): 50 Ohms; Frequency Stability: ±50ppm; Frequency Tolerance: ±30ppm; Operating Mode: Fundamental; ComponentLink1Description: Datasheet; ComponentLink1URL: http://www.ecsxtal.com/store/pdf/CSM-3X.pdf; ComponentLink2Description: DigiKey Link; ComponentLink2URL: http://digikey.com/product-detail/en/ecs-inc/ECS-184-20-3X-TR/XC1777CT-ND/2676641; Frequency: 18.432MHz; Height - Seated (Max): 0.091" (2.30mm); LastUpdated: 9/2/2020 1:21:54 AM; Lifecycle Status: Active; Load Capacitance: 20pF; Minimum Order: 1; Mounting Type: Surface Mount; Operating Temperature: -10°C ~ 70°C; Package / Case: HC-49/US; Packaging: TapeAndReel; PartId: 402; Part Status: Active; Price: 0.17; Series: CSM-3X; Size / Dimension: 0.276" L x 0.161" W (7.00mm x 4.10mm); Supplier 1: DigiKey; Supplier Part Number 1: XC1777CT-ND; Type: MHz Crystal; Value: 18.432MHz
footprint ECS CSM-3X
pins: 1, 2

## ECS-200-20-3X-EN-TR
designator Y?, comment 20MHz
CRYSTAL 20.0000MHZ 20PF SMD; Part Number: ECS-200-20-3X-EN-TR; Manufacturer: ECS Inc.; ESR (Equivalent Series Resistance): 50 Ohms; Frequency Stability: ±50ppm; Frequency Tolerance: ±30ppm; Operating Mode: Fundamental; ComponentLink1Description: Datasheet; ComponentLink1URL: http://www.ecsxtal.com/store/pdf/CSM-3X.pdf; ComponentLink2Description: DigiKey Link; ComponentLink2URL: http://digikey.com/product-detail/en/ecs-inc/ECS-200-20-3X-EN-TR/XC1796CT-ND/2676660; Frequency: 20MHz; Height - Seated (Max): 0.091" (2.30mm); LastUpdated: 9/2/2020 1:21:54 AM; Lifecycle Status: Active; Load Capacitance: 20pF; Minimum Order: 1; Mounting Type: Surface Mount; Operating Temperature: -40°C ~ 85°C; Package / Case: HC-49/US; Packaging: TapeAndReel; PartId: 408; Part Status: Active; Price: 0.24; Series: CSM-3X; Size / Dimension: 0.276" L x 0.161" W (7.00mm x 4.10mm); Supplier 1: DigiKey; Supplier Part Number 1: XC1796CT-ND; Type: MHz Crystal; Value: 20MHz
footprint ECS CSM-3X
pins: 1, 2

## ECS-200-20-3X-TR
designator Y?, comment 20MHz
CRYSTAL 20.0000MHZ 20PF SMD; Part Number: ECS-200-20-3X-TR; Manufacturer: ECS Inc.; ESR (Equivalent Series Resistance): 50 Ohms; Frequency Stability: ±50ppm; Frequency Tolerance: ±30ppm; Operating Mode: Fundamental; ComponentLink1Description: Datasheet; ComponentLink1URL: http://www.ecsxtal.com/store/pdf/CSM-3X.pdf; ComponentLink2Description: DigiKey Link; ComponentLink2URL: http://digikey.com/product-detail/en/ecs-inc/ECS-200-20-3X-TR/XC1779CT-ND/2676643; Frequency: 20MHz; Height - Seated (Max): 0.091" (2.30mm); LastUpdated: 9/2/2020 1:21:54 AM; Lifecycle Status: Active; Load Capacitance: 20pF; Minimum Order: 1; Mounting Type: Surface Mount; Operating Temperature: -10°C ~ 70°C; Package / Case: HC-49/US; Packaging: TapeAndReel; PartId: 416; Part Status: Active; Price: 0.17; Series: CSM-3X; Size / Dimension: 0.276" L x 0.161" W (7.00mm x 4.10mm); Supplier 1: DigiKey; Supplier Part Number 1: XC1779CT-ND; Type: MHz Crystal; Value: 20MHz
footprint ECS CSM-3X
pins: 1, 2

## ECS-200-CDX-0914
designator Y?, comment 20MHz
CRYSTAL 20.0000MHZ 10PF SMD; Part Number: ECS-200-CDX-0914; Manufacturer: ECS Inc.; ESR (Equivalent Series Resistance): 50 Ohms; Frequency Stability: ±30ppm; Frequency Tolerance: ±10ppm; Operating Mode: Fundamental; ComponentLink1Description: Datasheet; ComponentLink1URL: http://www.ecsxtal.com/store/pdf/partnumber4.pdf; ComponentLink2Description: DigiKey Link; ComponentLink2URL: http://digikey.com/product-detail/en/ecs-inc/ECS-200-CDX-0914/XC1929CT-ND/3927419; Frequency: 20MHz; Height - Seated (Max): 0.091" (2.30mm); LastUpdated: 9/2/2020 1:21:54 AM; Lifecycle Status: Active; Load Capacitance: 10pF; Minimum Order: 1; Mounting Type: Surface Mount; Operating Temperature: -60°C ~ 105°C; Package / Case: HC-49/US; Packaging: TapeAndReel; PartId: 426; Part Status: Active; Price: 0.48; Series: CSM-3X; Size / Dimension: 0.299" L x 0.161" W (7.60mm x 4.10mm); Supplier 1: DigiKey; Supplier Part Number 1: XC1929CT-ND; Type: MHz Crystal; Value: 20MHz
footprint ECS CSM-3X
pins: 1, 2

## ECS-245.7-20-3X-EN-TR
designator Y?, comment 24.576MHz
CRYSTAL 24.5760MHZ 20PF SMD; Part Number: ECS-245.7-20-3X-EN-TR; Manufacturer: ECS Inc.; ESR (Equivalent Series Resistance): 50 Ohms; Frequency Stability: ±50ppm; Frequency Tolerance: ±30ppm; Operating Mode: Fundamental; ComponentLink1Description: Datasheet; ComponentLink1URL: http://www.ecsxtal.com/store/pdf/CSM-3X.pdf; ComponentLink2Description: DigiKey Link; ComponentLink2URL: http://digikey.com/product-detail/en/ecs-inc/ECS-245.7-20-3X-EN-TR/XC1797CT-ND/2676661; Frequency: 24.576MHz; Height - Seated (Max): 0.091" (2.30mm); LastUpdated: 9/2/2020 1:21:54 AM; Lifecycle Status: Active; Load Capacitance: 20pF; Minimum Order: 1; Mounting Type: Surface Mount; Operating Temperature: -40°C ~ 85°C; Package / Case: HC-49/US; Packaging: TapeAndReel; PartId: 399; Part Status: Active; Price: 0.17; Series: CSM-3X; Size / Dimension: 0.276" L x 0.161" W (7.00mm x 4.10mm); Supplier 1: DigiKey; Supplier Part Number 1: XC1797CT-ND; Type: MHz Crystal; Value: 24.576MHz
footprint ECS CSM-3X
pins: 1, 2

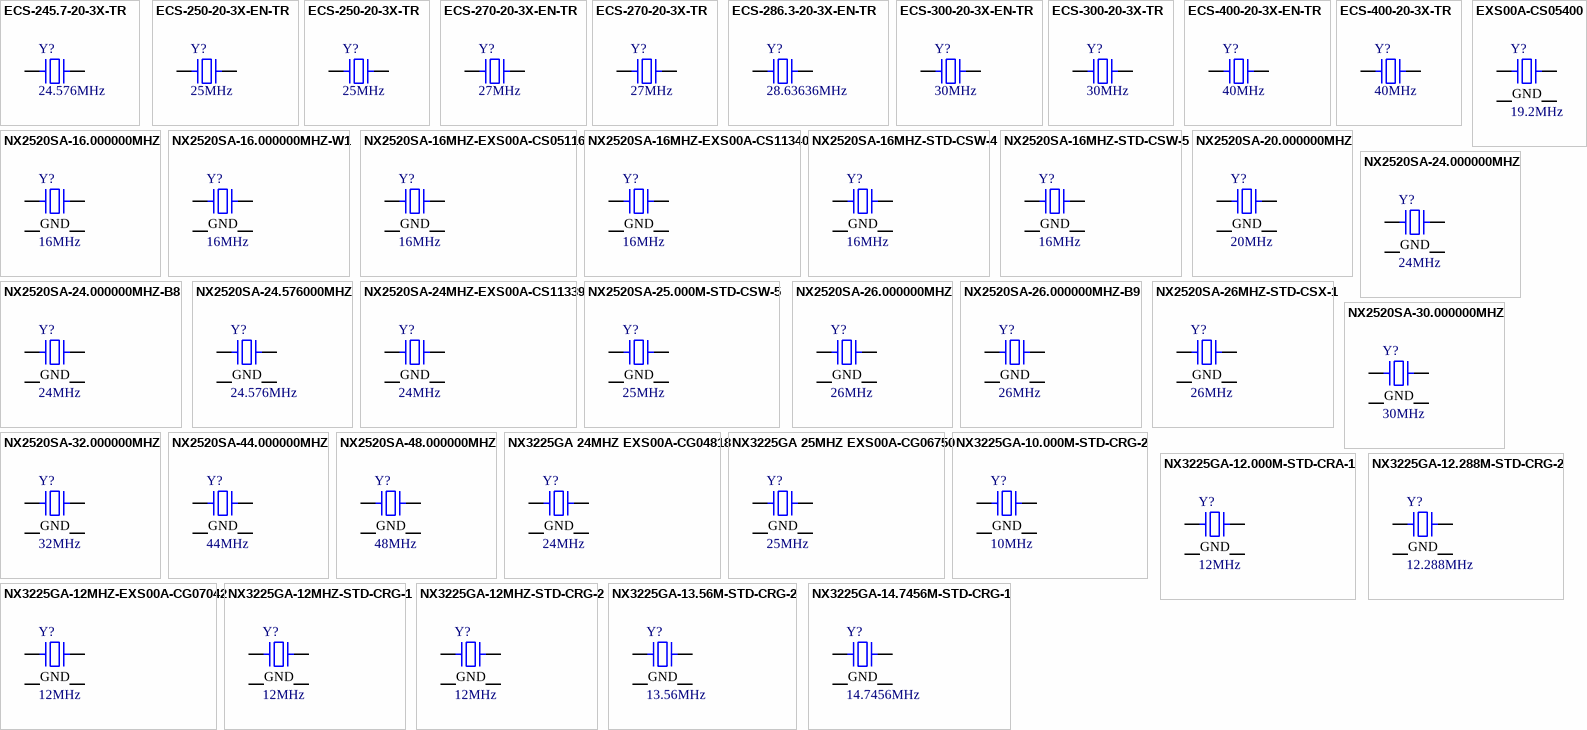
[diagram p14: symbols ECS-245.7-20-3X-TR to NX3225GA-14.7456M-STD-CRG-1]

## ECS-245.7-20-3X-TR
designator Y?, comment 24.576MHz
CRYSTAL 24.5760MHZ 20PF SMD; Part Number: ECS-245.7-20-3X-TR; Manufacturer: ECS Inc.; ESR (Equivalent Series Resistance): 50 Ohms; Frequency Stability: ±50ppm; Frequency Tolerance: ±30ppm; Operating Mode: Fundamental; ComponentLink1Description: Datasheet; ComponentLink1URL: http://www.ecsxtal.com/store/pdf/CSM-3X.pdf; ComponentLink2Description: DigiKey Link; ComponentLink2URL: http://digikey.com/product-detail/en/ecs-inc/ECS-245.7-20-3X-TR/XC1780CT-ND/2676644; Frequency: 24.576MHz; Height - Seated (Max): 0.091" (2.30mm); LastUpdated: 9/2/2020 1:21:54 AM; Lifecycle Status: Active; Load Capacitance: 20pF; Minimum Order: 1; Mounting Type: Surface Mount; Operating Temperature: -10°C ~ 70°C; Package / Case: HC-49/US; Packaging: CutTape; PartId: 412; Part Status: Active; Price: 0.38; Series: CSM-3X; Size / Dimension: 0.276" L x 0.161" W (7.00mm x 4.10mm); Supplier 1: DigiKey; Supplier Part Number 1: XC1780CT-ND; Type: MHz Crystal; Value: 24.576MHz
footprint ECS CSM-3X
pins: 1, 2

## ECS-250-20-3X-EN-TR
designator Y?, comment 25MHz